# Altium footprint library HARTING THD.PcbLib: 113 footprints (part 11 of 11)
Each footprint in its own frame and in the unit in brackets; x right, y up, seen from the top. Pads: shape width x height; smd on the part's side, far side on the other; paste and mask are expansions set on the pad; w line width, h text height; cw(c..) or ccw(c..) is an arc to the next point about the centre after c.
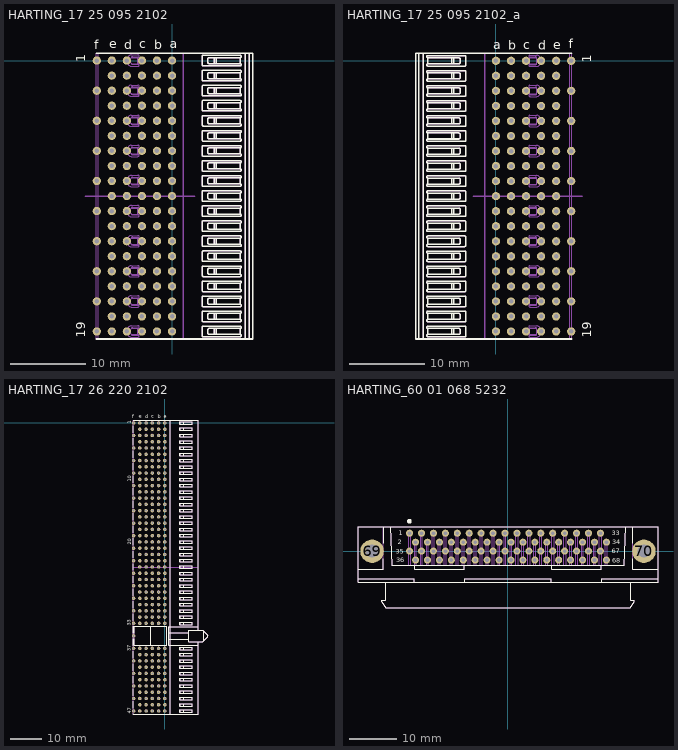
[diagram p10: the footprints below, top view; thin cyan lines are the x and y axes]

## HARTING_17 25 095 2102 [mm] "Type B19, 95 Contacts (abcde) Female Connector, Angled, HAR-BUS HM with Pre-installed Upper Shield (f)"
height 11
pads (105):
  round 1.1 hole 0.6: a1(0,0) a2(0,-2) a3(0,-4) a4(0,-6) a5(0,-8) a6(0,-10) a7(0,-12) a8(0,-14) a9(0,-16) a10(0,-18) a11(0,-20) a12(0,-22) a13(0,-24) a14(0,-26) a15(0,-28) a16(0,-30) a17(0,-32) a18(0,-34) a19(0,-36) b1(-2,0) b2(-2,-2) b3(-2,-4) b4(-2,-6) b5(-2,-8) b6(-2,-10) b7(-2,-12) b8(-2,-14) b9(-2,-16) b10(-2,-18) b11(-2,-20) b12(-2,-22) b13(-2,-24) b14(-2,-26) b15(-2,-28) b16(-2,-30) b17(-2,-32) b18(-2,-34) b19(-2,-36) c1(-4,0) c2(-4,-2) c3(-4,-4) c4(-4,-6) c5(-4,-8) c6(-4,-10) c7(-4,-12) c8(-4,-14) c9(-4,-16) c10(-4,-18) c11(-4,-20) c12(-4,-22) c13(-4,-24) c14(-4,-26) c15(-4,-28) c16(-4,-30) c17(-4,-32) c18(-4,-34) c19(-4,-36) d1(-6,0) d2(-6,-2) d3(-6,-4) d4(-6,-6) d5(-6,-8) d6(-6,-10) d7(-6,-12) d8(-6,-14) d9(-6,-16) d10(-6,-18) d11(-6,-20) d12(-6,-22) d13(-6,-24) d14(-6,-26) d15(-6,-28) d16(-6,-30) d17(-6,-32) d18(-6,-34) d19(-6,-36) e1(-8,0) e2(-8,-2) e3(-8,-4) e4(-8,-6) e5(-8,-8) e6(-8,-10) e7(-8,-12) e8(-8,-14) e9(-8,-16) e10(-8,-18) e11(-8,-20) e12(-8,-22) e13(-8,-24) e14(-8,-26) e15(-8,-28) e16(-8,-30) e17(-8,-32) e18(-8,-34) e19(-8,-36) f1(-10,0) f3(-10,-4) f5(-10,-8) f7(-10,-12) f9(-10,-16) f11(-10,-20) f13(-10,-24) f15(-10,-28) f17(-10,-32) f19(-10,-36)
Top Overlay:
  drawing of 368 lines, arcs and shapes, not listed
  text "19" at -11.5,-36.833 h1.2
  text "1" at -11.5,-0.25 h1.2
  text "e" at -8.333,1.667 h1.2
  text "d" at -6.333,1.5 h1.2
  text "c" at -4.333,1.667 h1.2
  text "b" at -2.333,1.5 h1.2
  text "a" at -0.333,1.667 h1.2
  text "f" at -10.363,1.5 h1.2
Mechanical 8:
  lines w0.2: -11.5,-18 3,-18 ; 1.5,-36.9 1.5,0.9
  text "PCB" at 0.5,-20 h1.2
Mechanical 14:
  drawing of 521 lines, arcs and shapes, not listed
  text "a" at -0.333,1.667 h1.2
  text "b" at -2.333,1.5 h1.2
  text "c" at -4.333,1.667 h1.2
  text "d" at -6.333,1.5 h1.2
  text "e" at -8.333,1.667 h1.2
  text "f" at -10.363,1.5 h1.2
  text "1" at -11.5,-0.25 h1.2
  text "19" at -11.5,-36.833 h1.2
Drill Drawing:
  lines w0.1: -11,-37 -11,1 1,1 1,-37 -11,-37
  text "PRESS-FIT TECHNOLOGY diam. 0.6mm +0.05 -0" at 2.575,-35.648 h1
3D body "HARTING_17.25.095.2102.stp": height 8.15, standoff -3.67, extent -10.1,-36.95 10.7,0.95

## HARTING_17 25 095 2102_a [mm] "Type B19, 95 Contacts (abcde) Female Connector, Angled, HAR-BUS HM with Pre-installed Upper Shield (f), (Footprint for Rear Transition Module (RTM))"
height 11
pads (105):
  round 1.1 hole 0.6: a1(0,0) a2(0,-2) a3(0,-4) a4(0,-6) a5(0,-8) a6(0,-10) a7(0,-12) a8(0,-14) a9(0,-16) a10(0,-18) a11(0,-20) a12(0,-22) a13(0,-24) a14(0,-26) a15(0,-28) a16(0,-30) a17(0,-32) a18(0,-34) a19(0,-36) b1(2,0) b2(2,-2) b3(2,-4) b4(2,-6) b5(2,-8) b6(2,-10) b7(2,-12) b8(2,-14) b9(2,-16) b10(2,-18) b11(2,-20) b12(2,-22) b13(2,-24) b14(2,-26) b15(2,-28) b16(2,-30) b17(2,-32) b18(2,-34) b19(2,-36) c1(4,0) c2(4,-2) c3(4,-4) c4(4,-6) c5(4,-8) c6(4,-10) c7(4,-12) c8(4,-14) c9(4,-16) c10(4,-18) c11(4,-20) c12(4,-22) c13(4,-24) c14(4,-26) c15(4,-28) c16(4,-30) c17(4,-32) c18(4,-34) c19(4,-36) d1(6,0) d2(6,-2) d3(6,-4) d4(6,-6) d5(6,-8) d6(6,-10) d7(6,-12) d8(6,-14) d9(6,-16) d10(6,-18) d11(6,-20) d12(6,-22) d13(6,-24) d14(6,-26) d15(6,-28) d16(6,-30) d17(6,-32) d18(6,-34) d19(6,-36) e1(8,0) e2(8,-2) e3(8,-4) e4(8,-6) e5(8,-8) e6(8,-10) e7(8,-12) e8(8,-14) e9(8,-16) e10(8,-18) e11(8,-20) e12(8,-22) e13(8,-24) e14(8,-26) e15(8,-28) e16(8,-30) e17(8,-32) e18(8,-34) e19(8,-36) f1(10,0) f3(10,-4) f5(10,-8) f7(10,-12) f9(10,-16) f11(10,-20) f13(10,-24) f15(10,-28) f17(10,-32) f19(10,-36)
Top Overlay:
  drawing of 368 lines, arcs and shapes, not listed
  text "f" at 9.663,1.7 h1.2
  text "a" at -0.367,1.533 h1.2
  text "b" at 1.633,1.5 h1.2
  text "c" at 3.633,1.533 h1.2
  text "d" at 5.633,1.5 h1.2
  text "e" at 7.633,1.533 h1.2
  text "1" at 12.7,-0.25 h1.2
  text "19" at 12.7,-36.833 h1.2
Mechanical 8:
  lines w0.1: -0.5,-36 0,-36 ; -0.5,-34 0,-34 ; -0.5,-32 0,-32 ; -0.5,-30 0,-30 ; -0.5,-28 0,-28 ; -0.5,-26 0,-26 ; -0.5,-24 0,-24 ; -0.5,-22 0,-22 ; -0.5,-20 0,-20 ; -0.5,-18 0,-18 ; -0.5,-16 0,-16 ; -0.5,-14 0,-14 ; -0.5,-12 0,-12 ; -0.5,-10 0,-10 ; -0.5,-8 0,-8 ; -0.5,-6 0,-6 ; -0.5,-4 0,-4 ; -0.5,-2 0,-2 ; -0.5,0 0,0 ; 0,-36.5 0,-36 ; 0,-35.5 0,-36 ; 0,-34.5 0,-34 ; 0,-33.5 0,-34 ; 0,-32.5 0,-32 ; 0,-31.5 0,-32 ; 0,-30.5 0,-30 ; 0,-29.5 0,-30 ; 0,-28.5 0,-28 ; 0,-27.5 0,-28 ; 0,-26.5 0,-26 ; 0,-25.5 0,-26 ; 0,-24.5 0,-24 ; 0,-23.5 0,-24 ; 0,-22.5 0,-22 ; 0,-21.5 0,-22 ; 0,-20.5 0,-20 ; 0,-19.5 0,-20 ; 0,-18.5 0,-18 ; 0,-17.5 0,-18 ; 0,-16.5 0,-16 ; 0,-15.5 0,-16 ; 0,-14.5 0,-14 ; 0,-13.5 0,-14 ; 0,-12.5 0,-12 ; 0,-11.5 0,-12 ; 0,-10.5 0,-10 ; 0,-9.5 0,-10 ; 0,-8.5 0,-8 ; 0,-7.5 0,-8 ; 0,-6.5 0,-6 ; 0,-5.5 0,-6 ; 0,-4.5 0,-4 ; 0,-3.5 0,-4 ; 0,-2.5 0,-2 ; 0,-1.5 0,-2 ; 0,-0.5 0,0 ; 0,0.5 0,0 ; 0.5,-36 0,-36 ; 0.5,-34 0,-34 ; 0.5,-32 0,-32 ; 0.5,-30 0,-30 ; 0.5,-28 0,-28 ; 0.5,-26 0,-26 ; 0.5,-24 0,-24 ; 0.5,-22 0,-22 ; 0.5,-20 0,-20 ; 0.5,-18 0,-18 ; 0.5,-16 0,-16 ; 0.5,-14 0,-14 ; 0.5,-12 0,-12 ; 0.5,-10 0,-10 ; 0.5,-8 0,-8 ; 0.5,-6 0,-6 ; 0.5,-4 0,-4 ; 0.5,-2 0,-2 ; 0.5,0 0,0 ; 1.5,0 2,0 ; 2,-0.5 2,0 ; 2,0.5 2,0 ; 2.5,0 2,0 ; 3.5,0 4,0 ; 4,-0.5 4,0 ; 4,0.5 4,0 ; 4.5,0 4,0 ; 5.5,0 6,0 ; 6,-0.5 6,0 ; 6,0.5 6,0 ; 6.5,0 6,0 ; 7.5,0 8,0 ; 8,-0.5 8,0 ; 8,0.5 8,0 ; 8.5,0 8,0 ; 9.5,0 10,0 ; 10,-0.5 10,0 ; 10,0.5 10,0 ; 10.5,0 10,0
  lines w0.2: -3,-18 11.5,-18 ; -1.5,-36.9 -1.5,0.9
  text "PCB" at 0.5,-20 h1.2
Mechanical 14:
  drawing of 521 lines, arcs and shapes, not listed
  text "19" at 12.7,-36.833 h1.2
  text "1" at 12.7,-0.25 h1.2
  text "f" at 9.663,1.7 h1.2
  text "e" at 7.633,1.533 h1.2
  text "d" at 5.633,1.5 h1.2
  text "c" at 3.633,1.533 h1.2
  text "b" at 1.633,1.5 h1.2
  text "a" at -0.367,1.533 h1.2
Drill Drawing:
  lines w0.1: -1,-37 11,-37 11,1 -1,1 -1,-37
  text "PRESS-FIT TECHNOLOGY diam. 0.6mm +0.05 -0" at -1.625,-35.648 h1
3D body "HARTING_17 25 095 2102_a.stp": height 8.15, standoff -3.67, extent -10.7,-36.95 10.1,0.95

## HARTING_17 26 220 2102 [mm] "HAR-BUS HM, 220 Contacts (abcdef) Female Connector, Type Monoblock 47, with Shield  Row(f)"
height 12.35
pads (244):
  round 1.1 hole 0.6: a1(0,0) a2(0,-2) a3(0,-4) a4(0,-6) a5(0,-8) a6(0,-10) a7(0,-12) a8(0,-14) a9(0,-16) a10(0,-18) a11(0,-20) a12(0,-22) a13(0,-24) a14(0,-26) a15(0,-28) a16(0,-30) a17(0,-32) a18(0,-34) a19(0,-36) a20(0,-38) a21(0,-40) a22(0,-42) a23(0,-44) a24(0,-46) a25(0,-48) a26(0,-50) a27(0,-52) a28(0,-54) a29(0,-56) a30(0,-58) a31(0,-60) a32(0,-62) a33(0,-64) a37(0,-72) a38(0,-74) a39(0,-76) a40(0,-78) a41(0,-80) a42(0,-82) a43(0,-84) a44(0,-86) a45(0,-88) a46(0,-90) a47(0,-92) b1(-2,0) b2(-2,-2) b3(-2,-4) b4(-2,-6) b5(-2,-8) b6(-2,-10) b7(-2,-12) b8(-2,-14) b9(-2,-16) b10(-2,-18) b11(-2,-20) b12(-2,-22) b13(-2,-24) b14(-2,-26) b15(-2,-28) b16(-2,-30) b17(-2,-32) b18(-2,-34) b19(-2,-36) b20(-2,-38) b21(-2,-40) b22(-2,-42) b23(-2,-44) b24(-2,-46) b25(-2,-48) b26(-2,-50) b27(-2,-52) b28(-2,-54) b29(-2,-56) b30(-2,-58) b31(-2,-60) b32(-2,-62) b33(-2,-64) b37(-2,-72) b38(-2,-74) b39(-2,-76) b40(-2,-78) b41(-2,-80) b42(-2,-82) b43(-2,-84) b44(-2,-86) b45(-2,-88) b46(-2,-90) b47(-2,-92) c1(-4,0) c2(-4,-2) c3(-4,-4) c4(-4,-6) c5(-4,-8) c6(-4,-10) c7(-4,-12) c8(-4,-14) c9(-4,-16) c10(-4,-18) c11(-4,-20) c12(-4,-22) c13(-4,-24) c14(-4,-26) c15(-4,-28) c16(-4,-30) c17(-4,-32) c18(-4,-34) c19(-4,-36) c20(-4,-38) c21(-4,-40) c22(-4,-42) c23(-4,-44) c24(-4,-46) c25(-4,-48) c26(-4,-50) c27(-4,-52) c28(-4,-54) c29(-4,-56) c30(-4,-58) c31(-4,-60) c32(-4,-62) c33(-4,-64) c37(-4,-72) c38(-4,-74) c39(-4,-76) c40(-4,-78) c41(-4,-80) c42(-4,-82) c43(-4,-84) c44(-4,-86) c45(-4,-88) c46(-4,-90) c47(-4,-92) d1(-6,0) d2(-6,-2) d3(-6,-4) d4(-6,-6) d5(-6,-8) d6(-6,-10) d7(-6,-12) d8(-6,-14) d9(-6,-16) d10(-6,-18) d11(-6,-20) d12(-6,-22) d13(-6,-24) d14(-6,-26) d15(-6,-28) d16(-6,-30) d17(-6,-32) d18(-6,-34) d19(-6,-36) d20(-6,-38) d21(-6,-40) d22(-6,-42) d23(-6,-44) d24(-6,-46) d25(-6,-48) d26(-6,-50) d27(-6,-52) d28(-6,-54) d29(-6,-56) d30(-6,-58) d31(-6,-60) d32(-6,-62) d33(-6,-64) d37(-6,-72) d38(-6,-74) d39(-6,-76) d40(-6,-78) d41(-6,-80) d42(-6,-82) d43(-6,-84) d44(-6,-86) d45(-6,-88) d46(-6,-90) d47(-6,-92) e1(-8,0) e2(-8,-2) e3(-8,-4) e4(-8,-6) e5(-8,-8) e6(-8,-10) e7(-8,-12) e8(-8,-14) e9(-8,-16) e10(-8,-18) e11(-8,-20) e12(-8,-22) e13(-8,-24) e14(-8,-26) e15(-8,-28) e16(-8,-30) e17(-8,-32) e18(-8,-34) e19(-8,-36) e20(-8,-38) e21(-8,-40) e22(-8,-42) e23(-8,-44) e24(-8,-46) e25(-8,-48) e26(-8,-50) e27(-8,-52) e28(-8,-54) e29(-8,-56) e30(-8,-58) e31(-8,-60) e32(-8,-62) e33(-8,-64) e37(-8,-72) e38(-8,-74) e39(-8,-76) e40(-8,-78) e41(-8,-80) e42(-8,-82) e43(-8,-84) e44(-8,-86) e45(-8,-88) e46(-8,-90) e47(-8,-92) f1(-10,0) f3(-10,-4) f5(-10,-8) f7(-10,-12) f9(-10,-16) f11(-10,-20) f13(-10,-24) f15(-10,-28) f17(-10,-32) f19(-10,-36) f21(-10,-40) f23(-10,-44) f25(-10,-48) f27(-10,-52) f29(-10,-56) f31(-10,-60) f33(-10,-64) f35(-10,-68) f37(-10,-72) f39(-10,-76) f41(-10,-80) f43(-10,-84) f45(-10,-88) f47(-10,-92)
Top Overlay:
  drawing of 312 lines, arcs and shapes, not listed
  text "20" at -10.7,-38.833 h1.2
  text "10" at -10.7,-18.833 h1.2
  text "47" at -10.7,-92.833 h1.2
  text "37" at -10.9,-72.833 h1.2
  text "33" at -10.9,-64.833 h1.2
  text "f" at -10.363,1.5 h1.2
  text "a" at -0.333,1.667 h1.2
  text "b" at -2.333,1.5 h1.2
  text "c" at -4.333,1.667 h1.2
  text "d" at -6.333,1.5 h1.2
  text "e" at -8.333,1.667 h1.2
  text "1" at -10.7,-0.25 h1.2
Mechanical 8:
  drawing of 491 lines, arcs and shapes, not listed
  text "PCB" at 1.3,-48 h1.5
Mechanical 14:
  drawing of 287 lines, arcs and shapes, not listed
  text "20" at -10.7,-38.833 h1.2
  text "10" at -10.7,-18.833 h1.2
  text "47" at -10.7,-92.833 h1.2
  text "37" at -10.9,-72.833 h1.2
  text "33" at -10.9,-64.833 h1.2
  text "1" at -10.7,-0.25 h1.2
  text "f" at -10.363,1.5 h1.2
  text "e" at -8.333,1.667 h1.2
  text "d" at -6.333,1.5 h1.2
  text "c" at -4.333,1.667 h1.2
  text "b" at -2.333,1.5 h1.2
  text "a" at -0.333,1.667 h1.2
Drill Drawing:
  lines w0.1: -11,-92.95 -11,1 ; 1,-92.95 1,1
  lines w0.2: -11,-92.95 1,-92.95 ; -11,1 1,1
  text "PRESS-FIT TECHNOLOGY diam. 0.6mm +0.05 -0" at 2.625,-67.398 h1
3D body "HARTING_17 26 220 2102.stp": height 8.15, standoff -4.1, extent -10.1,-92.95 13.65,0.95

## HARTING_60 01 068 5232 [mm] "68 Positions, Pitch 1.27mm, Right Angle HAR-MIK Male Connector, Panel Fixing M2.5 / PCB Fixing M2.5"
height 9.5
pads (70):
  round 1.5 hole 0.8: 1(-20.955,3.81) 2(-19.685,1.905) 3(-18.415,3.81) 4(-17.145,1.905) 5(-15.875,3.81) 6(-14.605,1.905) 7(-13.335,3.81) 8(-12.065,1.905) 9(-10.795,3.81) 10(-9.525,1.905) 11(-8.255,3.81) 12(-6.985,1.905) 13(-5.715,3.81) 14(-4.445,1.905) 15(-3.175,3.81) 16(-1.905,1.905) 17(-0.635,3.81) 18(0.635,1.905) 19(1.905,3.81) 20(3.175,1.905) 21(4.445,3.81) 22(5.715,1.905) 23(6.985,3.81) 24(8.255,1.905) 25(9.525,3.81) 26(10.795,1.905) 27(12.065,3.81) 28(13.335,1.905) 29(14.605,3.81) 30(15.875,1.905) 31(17.145,3.81) 32(18.415,1.905) 33(19.685,3.81) 34(20.955,1.905) 35(-20.955,0) 36(-19.685,-1.905) 37(-18.415,0) 38(-17.145,-1.905) 39(-15.875,0) 40(-14.605,-1.905) 41(-13.335,0) 42(-12.065,-1.905) 43(-10.795,0) 44(-9.525,-1.905) 45(-8.255,0) 46(-6.985,-1.905) 47(-5.715,0) 48(-4.445,-1.905) 49(-3.175,0) 50(-1.905,-1.905) 51(-0.635,0) 52(0.635,-1.905) 53(1.905,0) 54(3.175,-1.905) 55(4.445,0) 56(5.715,-1.905) 57(6.985,0) 58(8.255,-1.905) 59(9.525,0) 60(10.795,-1.905) 61(12.065,0) 62(13.335,-1.905) 63(14.605,0) 64(15.875,-1.905) 65(17.145,0) 66(18.415,-1.905) 67(19.685,0) 68(20.955,-1.905)
  round 5 hole 2.8: 69(-28.94,0) 70(28.94,0)
Top Overlay:
  circle w0.5: c-21,6.375 r0.25
  lines w0.2: -31.94,-5.904 -19.941,-5.904 -19.941,-6.604 ; -31.94,-3.805 -26.515,-3.805 -26.515,-1.6 ; -26.506,1.65 -26.506,5.194 ; -26.116,-6.604 -26.115,-10.504 -26.915,-10.504 -26.915,-10.804 -26.04,-12.104 26.04,-12.104 26.915,-10.804 26.915,-10.504 26.115,-10.504 26.115,-6.604 ; -25.116,5.194 -24.716,-3.005 24.715,-3.005 25.115,5.194 ; -19.841,-3.005 -19.841,-3.805 -9.317,-3.805 -9.317,-3.005 ; -9.217,-6.604 -9.217,-5.904 9.217,-5.904 9.217,-6.604 ; 9.317,-3.005 9.317,-3.805 19.841,-3.805 19.841,-3.005 ; 19.941,-6.604 19.941,-5.904 31.94,-5.904 ; 26.515,-1.6 26.515,-3.805 31.94,-3.805 ; 26.525,1.65 26.525,5.194 ; -31.94,-6.604 31.94,-6.604 31.94,5.194 -31.94,5.194 -31.94,-6.604
  text "34" at 22.15,1.425 h1
  text "67" at 22.125,-0.425 h1
  text "68" at 22.15,-2.425 h1
  text "33" at 22.1,3.4 h1
  text "36" at -23.825,-2.35 h1
  text "1" at -23.275,3.35 h1
  text "2" at -23.45,1.477 h1
  text "35" at -23.875,-0.523 h1
Mechanical 8:
  drawing of 280 lines, arcs and shapes, not listed
Mechanical 14:
  circle w0.1: c28.94,0 r1.006
  circle w0.1: c-28.94,0 r1.006
  lines w0.1: -31.94,-5.904 -19.941,-5.904 -19.941,-6.604 ; -31.94,-3.805 -26.515,-3.805 -26.515,5.194 ; -26.116,-6.604 -26.115,-10.504 -26.915,-10.504 -26.915,-10.804 -26.04,-12.104 26.04,-12.104 26.915,-10.804 26.915,-10.504 26.115,-10.504 26.115,-6.604 ; -25.116,5.194 -24.716,-3.005 24.715,-3.005 25.115,5.194 ; -21.156,-3.005 -21.156,4.12 -20.756,4.12 -20.756,-3.005 ; -19.886,-3.005 -19.886,2.22 -19.486,2.22 -19.486,-3.005 ; -19.841,-3.005 -19.841,-3.805 -9.317,-3.805 -9.317,-3.005 ; -18.616,-3.005 -18.616,4.12 -18.216,4.12 -18.216,-3.005 ; -17.346,-3.005 -17.346,2.22 -16.946,2.22 -16.946,-3.005 ; -16.076,-3.005 -16.076,4.12 -15.676,4.12 -15.676,-3.005 ; -14.807,-3.005 -14.807,2.22 -14.407,2.22 -14.407,-3.005 ; -13.537,-3.005 -13.537,4.12 -13.137,4.12 -13.137,-3.005 ; -12.267,-3.005 -12.267,2.22 -11.867,2.22 -11.867,-3.005 ; -10.997,-3.005 -10.997,4.12 -10.597,4.12 -10.597,-3.005 ; -9.727,-3.005 -9.727,2.22 -9.327,2.22 -9.327,-3.005 ; -9.217,-6.604 -9.217,-5.904 9.217,-5.904 9.217,-6.604 ; -8.457,-3.005 -8.457,4.12 -8.057,4.12 -8.057,-3.005 ; -7.187,-3.005 -7.187,2.22 -6.787,2.22 -6.787,-3.005 ; -5.917,-3.005 -5.917,4.12 -5.517,4.12 -5.517,-3.005 ; -4.647,-3.005 -4.647,2.22 -4.247,2.22 -4.247,-3.005 ; -3.378,-3.005 -3.378,4.12 -2.978,4.12 -2.978,-3.005 ; -2.108,-3.005 -2.108,2.22 -1.708,2.22 -1.708,-3.005 ; -0.838,-3.005 -0.838,4.12 -0.438,4.12 -0.438,-3.005 ; 0.432,-3.005 0.432,2.22 0.832,2.22 0.832,-3.005 ; 1.702,-3.005 1.702,4.12 2.102,4.12 2.102,-3.005 ; 2.972,-3.005 2.972,2.22 3.372,2.22 3.372,-3.005 ; 4.242,-3.005 4.242,4.12 4.642,4.12 4.642,-3.005 ; 5.512,-3.005 5.512,2.22 5.911,2.22 5.911,-3.005 ; 6.781,-3.005 6.781,4.12 7.181,4.12 7.181,-3.005 ; 8.051,-3.005 8.051,2.22 8.451,2.22 8.451,-3.005 ; 9.317,-3.005 9.317,-3.805 19.841,-3.805 19.841,-3.005 ; 9.321,-3.005 9.321,4.12 9.721,4.12 9.721,-3.005 ; 10.591,-3.005 10.591,2.22 10.991,2.22 10.991,-3.005 ; 11.861,-3.005 11.861,4.12 12.261,4.12 12.261,-3.005 ; 13.131,-3.005 13.131,2.22 13.531,2.22 13.531,-3.005 ; 14.401,-3.005 14.401,4.12 14.801,4.12 14.801,-3.005 ; 15.671,-3.005 15.671,2.22 16.071,2.22 16.071,-3.005 ; 16.941,-3.005 16.941,4.12 17.34,4.12 17.34,-3.005 ; 18.21,-3.005 18.21,2.22 18.61,2.22 18.61,-3.005 ; 19.48,-3.005 19.48,4.12 19.88,4.12 19.88,-3.005 ; 19.941,-6.604 19.941,-5.904 31.94,-5.904 ; 20.75,-3.005 20.75,2.22 21.15,2.22 21.15,-3.005 ; 26.515,5.194 26.515,-3.805 31.94,-3.805 ; -31.94,-6.604 31.94,-6.604 31.94,5.194 -31.94,5.194 -31.94,-6.604
  text "33" at 22.1,3.4 h1
  text "68" at 22.15,-2.425 h1
  text "67" at 22.125,-0.425 h1
  text "34" at 22.15,1.425 h1
  text "36" at -23.85,-2.375 h1.02
  text "1" at -23.275,3.327 h1.02
  text "2" at -23.45,1.477 h1.02
  text "35" at -23.875,-0.525 h1.02
3D body "HARTING_60 01 068 5232.stp": height 9.5, standoff -3.4, extent -31.94,-12.105 31.94,5.195